# Altium footprint library lib_datalogger.PcbLib: 866 footprints (part 32 of 55)
Each footprint in its own frame and in the unit in brackets; x right, y up, seen from the top. Pads: shape width x height; smd on the part's side, far side on the other; paste and mask are expansions set on the pad; w line width, h text height; cw(c..) or ccw(c..) is an arc to the next point about the centre after c.
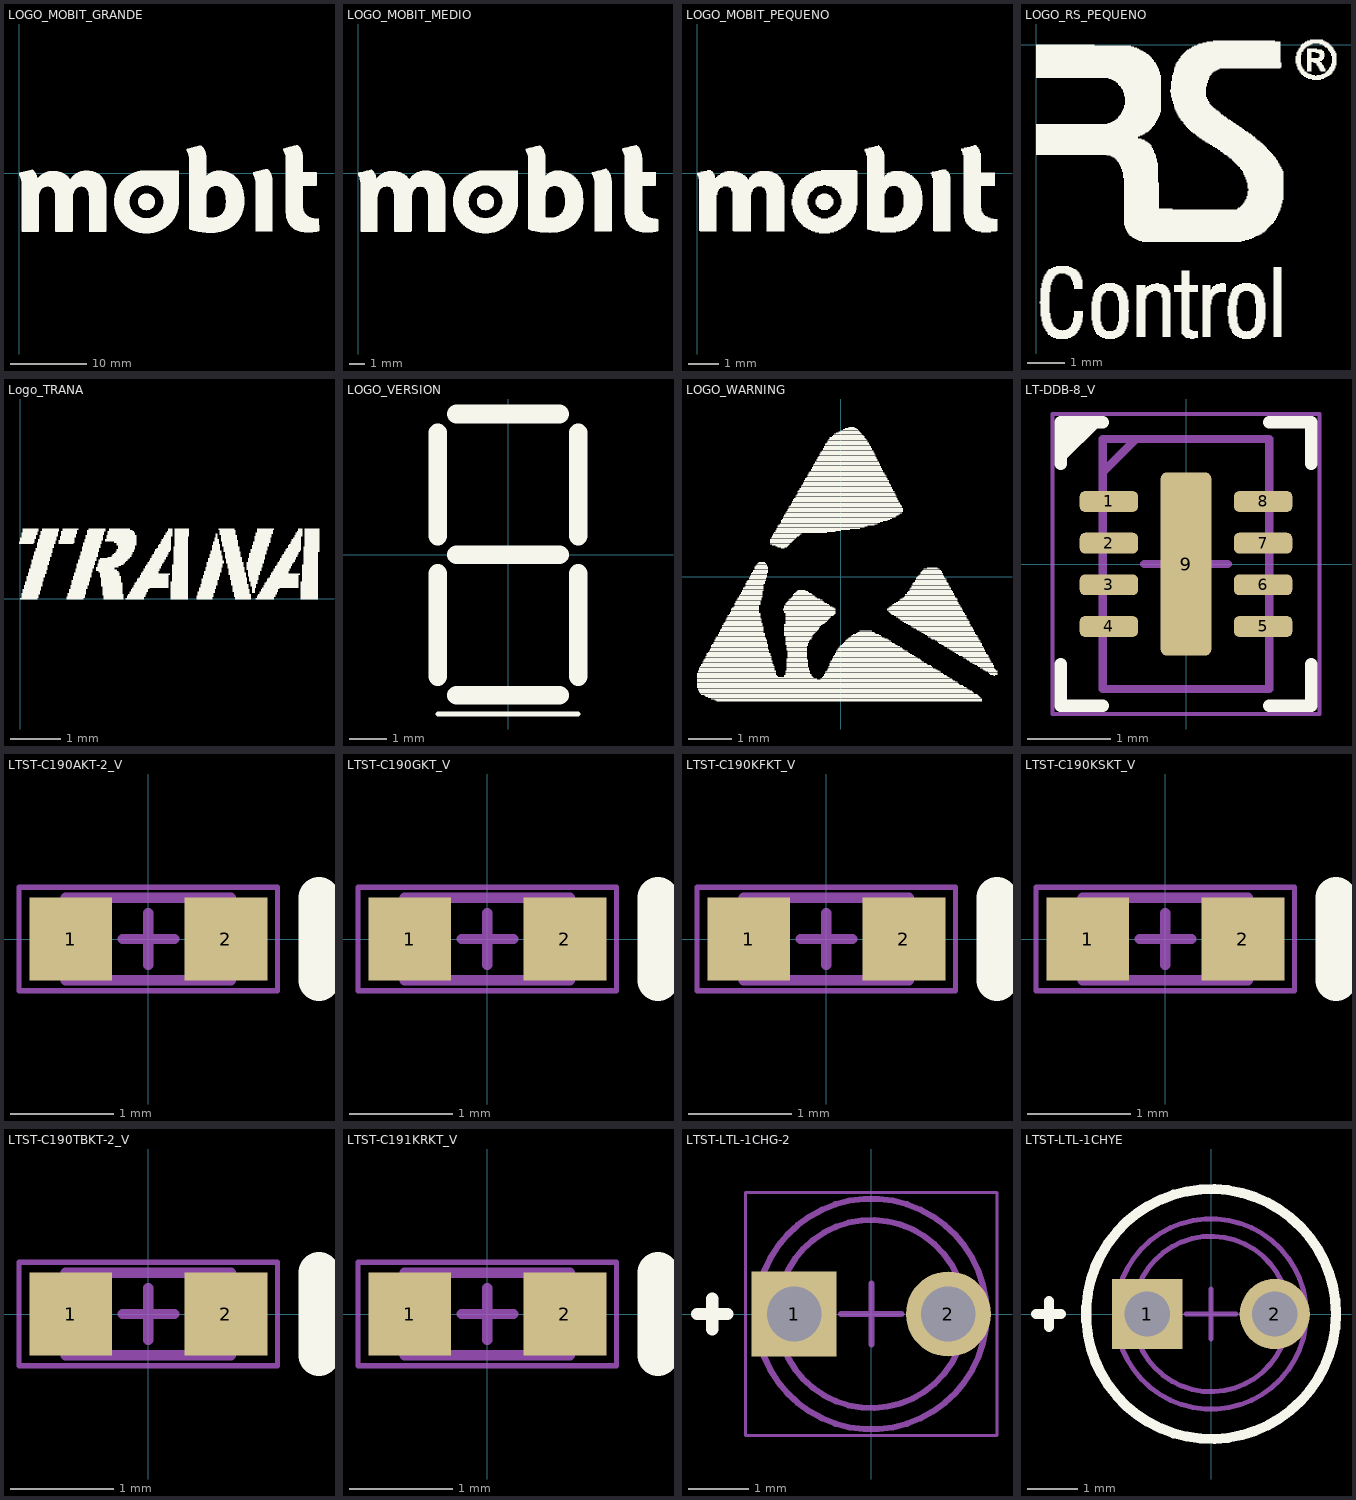
[diagram p31: the footprints below, top view; thin cyan lines are the x and y axes]

## LOGO_MOBIT_GRANDE [mm]
Top Overlay:
  drawing of 2847 lines, arcs and shapes, not listed

## LOGO_MOBIT_MEDIO [mm]
Top Overlay:
  drawing of 1430 lines, arcs and shapes, not listed

## LOGO_MOBIT_PEQUENO [mm]
Top Overlay:
  drawing of 712 lines, arcs and shapes, not listed

## LOGO_RS_PEQUENO [mm]
Top Overlay:
  drawing of 1124 lines, arcs and shapes, not listed

## Logo_TRANA [mm]
Top Overlay:
  drawing of 565 lines, arcs and shapes, not listed

## LOGO_VERSION [mm]
Top Overlay:
  lines w0.127: -1.905,-4.318 1.905,-4.318
  lines w0.508: -1.905,-3.302 -1.905,-0.508 ; -1.905,0.508 -1.905,3.302 ; -1.397,-3.81 1.397,-3.81 ; -1.397,0 1.397,0 ; -1.397,3.81 1.397,3.81 ; 1.905,-3.302 1.905,-0.508 ; 1.905,0.508 1.905,3.302

## LOGO_WARNING [mm] "WARNING SIGN"
Top Overlay:
  drawing of 457 lines, arcs and shapes, not listed

## LT-DDB-8_V [mm] "SON, 8-Leads, Body 3x2mm, Pitch 0.5mm, Thermal Pad 2.2x0.61mm"
height 0.8
pads (9):
  rrect50% 0.7x0.25 smd: 1(-0.925,0.75) 2(-0.925,0.25) 3(-0.925,-0.25) 4(-0.925,-0.75) 5(0.925,-0.75) 6(0.925,-0.25) 7(0.925,0.25) 8(0.925,0.75)
  rrect25% 0.61x2.2 smd: 9(0,0)
Top Overlay:
  region: -1.5,1.7 -1.5,1.3 -1.1,1.7
  lines w0.15: -1.5,-1.2 -1.5,-1.7 -1,-1.7 ; -1.5,1.2 -1.5,1.7 -1,1.7 ; -1.5,1.3 -1.1,1.7 ; 1,-1.7 1.5,-1.7 1.5,-1.2 ; 1,1.7 1.5,1.7 1.5,1.2
Mechanical 13:
  lines w0.1: -1,1.1 -0.6,1.5 ; -0.6,1.5 -0.6,1.5 ; -1,-1.5 -1,1.5 1,1.5 1,-1.5 -1,-1.5
Mechanical 15:
  lines w0.05: -1.6,-1.8 -1.6,1.8 1.6,1.8 1.6,-1.8 -1.6,-1.8
  lines w0.1: -0.5,0 0.5,0 ; 0,-0.5 0,0.5
Top Designator:
  text ".Designator" at -1.27,-0.127 h0.6
3D body "DFN-8_DDB.stp": height 0.8, standoff 0, extent -1.05,-1.55 1.05,1.55

## LTST-C190AKT-2_V [mm] "SMD, 2-Leads, Body 1.6x0.8mm"
height 0.8
pads (2):
  rect 0.8x0.8 smd: 1(-0.75,0) 2(0.75,0)
Top Overlay:
  lines w0.4: 1.65,-0.4 1.65,0.4
Mechanical 13:
  lines w0.1: -0.55,-0.4 -0.55,0.4 ; 0.55,-0.4 0.55,0.4 ; -0.8,-0.4 -0.8,0.4 0.8,0.4 0.8,-0.4 -0.8,-0.4
Mechanical 15:
  lines w0.05: -1.25,-0.5 1.25,-0.5 1.25,0.5 -1.25,0.5 -1.25,-0.5
  lines w0.1: -0.25,0 0.25,0 ; 0,-0.25 0,0.25
3D body: height 0.8, standoff 0.28, extent -0.55,-0.4 0.55,0.4
3D body: height 0.28, standoff 0, extent -0.8,-0.4 0.8,0.4

## LTST-C190GKT_V [mm] "SMD, 2-Leads, Body 1.6x0.8mm"
height 0.9
pads (2):
  rect 0.8x0.8 smd: 1(-0.75,0) 2(0.75,0)
Top Overlay:
  lines w0.4: 1.65,-0.4 1.65,0.4
Mechanical 13:
  lines w0.1: -0.55,-0.4 -0.55,0.4 ; 0.55,-0.4 0.55,0.4 ; -0.8,-0.4 0.8,-0.4 0.8,0.4 -0.8,0.4 -0.8,-0.4
Mechanical 15:
  lines w0.05: -1.25,-0.5 -1.25,0.5 1.25,0.5 1.25,-0.5 -1.25,-0.5
  lines w0.1: -0.25,0 0.25,0 ; 0,-0.25 0,0.25
3D body: height 0.38, standoff 0, extent -0.8,-0.4 0.8,0.4
3D body: height 0.9, standoff 0.38, extent -0.55,-0.4 0.55,0.4

## LTST-C190KFKT_V [mm] "SMD, 2-Leads, Body 1.6x0.8mm"
height 0.9
pads (2):
  rect 0.8x0.8 smd: 1(-0.75,0) 2(0.75,0)
Top Overlay:
  lines w0.4: 1.65,-0.4 1.65,0.4
Mechanical 13:
  lines w0.1: -0.55,-0.4 -0.55,0.4 ; 0.55,-0.4 0.55,0.4 ; -0.8,-0.4 -0.8,0.4 0.8,0.4 0.8,-0.4 -0.8,-0.4
Mechanical 15:
  lines w0.05: -1.25,-0.5 1.25,-0.5 1.25,0.5 -1.25,0.5 -1.25,-0.5
  lines w0.1: -0.25,0 0.25,0 ; 0,-0.25 0,0.25
3D body: height 0.9, standoff 0.28, extent -0.55,-0.4 0.55,0.4
3D body: height 0.28, standoff 0, extent -0.8,-0.4 0.8,0.4

## LTST-C190KSKT_V [mm] "SMD, 2-Leads, Body 1.6x0.8mm"
height 0.9
pads (2):
  rect 0.8x0.8 smd: 1(-0.75,0) 2(0.75,0)
Top Overlay:
  lines w0.4: 1.65,-0.4 1.65,0.4
Mechanical 13:
  lines w0.1: -0.55,-0.4 -0.55,0.4 ; 0.55,-0.4 0.55,0.4 ; -0.8,-0.4 -0.8,0.4 0.8,0.4 0.8,-0.4 -0.8,-0.4
Mechanical 15:
  lines w0.05: -1.25,-0.5 1.25,-0.5 1.25,0.5 -1.25,0.5 -1.25,-0.5
  lines w0.1: -0.25,0 0.25,0 ; 0,-0.25 0,0.25
3D body: height 0.9, standoff 0.28, extent -0.55,-0.4 0.55,0.4
3D body: height 0.28, standoff 0, extent -0.8,-0.4 0.8,0.4

## LTST-C190TBKT-2_V [mm] "SMD, 2-Leads, Body 1.6x0.8mm"
height 0.9
pads (2):
  rect 0.8x0.8 smd: 1(-0.75,0) 2(0.75,0)
Top Overlay:
  lines w0.4: 1.65,-0.4 1.65,0.4
Mechanical 13:
  lines w0.1: -0.8,-0.4 -0.8,0.4 0.8,0.4 0.8,-0.4 -0.8,-0.4
Mechanical 15:
  lines w0.05: -1.25,-0.5 1.25,-0.5 1.25,0.5 -1.25,0.5 -1.25,-0.5
  lines w0.1: -0.25,0 0.25,0 ; 0,-0.25 0,0.25
3D body: height 0.8, standoff 0.28, extent -0.55,-0.4 0.55,0.4
3D body: height 0.28, standoff 0, extent -0.8,-0.4 0.8,0.4

## LTST-C191KRKT_V [mm] "SMD, 2-Leads, Body 1.6x0.8mm"
height 0.9
pads (2):
  rect 0.8x0.8 smd: 1(-0.75,0) 2(0.75,0)
Top Overlay:
  lines w0.4: 1.65,-0.4 1.65,0.4
Mechanical 13:
  lines w0.1: -0.55,-0.4 -0.55,0.4 ; 0.55,-0.4 0.55,0.4 ; -0.8,-0.4 -0.8,0.4 0.8,0.4 0.8,-0.4 -0.8,-0.4
Mechanical 15:
  lines w0.05: -1.25,-0.5 1.25,-0.5 1.25,0.5 -1.25,0.5 -1.25,-0.5
  lines w0.1: -0.25,0 0.25,0 ; 0,-0.25 0,0.25
3D body: height 0.9, standoff 0.38, extent -0.55,-0.4 0.55,0.4
3D body: height 0.38, standoff 0, extent -0.8,-0.4 0.8,0.4

## LTST-LTL-1CHG-2 [mm] "TH, 2-Leads, Dia 3.8mm"
height 6.5
pads (2):
  rect 1.4x1.4 hole 0.9: 1(-1.27,0)
  round 1.4 hole 0.9: 2(1.27,0)
Top Overlay:
  lines w0.2: -2.87,0 -2.37,0 ; -2.62,-0.25 -2.62,0.25
Mechanical 13:
  circle w0.1: c0,0 r1.55
  circle w0.1: c0,0 r1.9
Mechanical 15:
  lines w0.05: -2.07,-1.999 2.07,-1.999 2.07,1.999 -2.07,1.999 -2.07,-1.999
  lines w0.1: -0.5,0 0.5,0 ; 0,-0.5 0,0.5
3D body: height 1, standoff -24, extent -1.495,-0.2 -1.045,0.2
3D body: height 1, standoff -23, extent 1.045,-0.2 1.495,0.2
3D body: height 6.5, standoff 3.4, extent -1.538,-1.547 1.55,1.547
3D body: height 4.95, standoff 1, extent -1.549,-1.549 1.55,1.55
3D body: height 1.7, standoff 1, extent -1.899,-1.899 1.9,1.9

## LTST-LTL-1CHYE [mm] "THD, 2-Leads, Dia 3.8mm, Pitch 2.54mm"
height 6.5
pads (2):
  rect 1.4x1.4 hole 0.9: 1(-1.27,0)
  round 1.4 hole 0.9: 2(1.27,0)
Top Overlay:
  circle w0.2: c0,0 r2.491
  lines w0.2: -3.489,0 -2.991,0 ; -3.23,-0.254 -3.23,0.254
Mechanical 13:
  circle w0.1: c0,0 r1.55
  circle w0.1: c0,0 r1.9
Mechanical 15:
  lines w0.1: -0.5,0 0.5,0 ; 0,-0.5 0,0.5
3D body: height 2.2, standoff 0, extent -1.9,-1.899 1.9,1.9
3D body: height 4.95, standoff 2.2, extent -1.55,-1.55 1.55,1.55
3D body: height 6.5, standoff 3.4, extent -1.548,-1.549 1.55,1.55
3D body: height 0, standoff -25, extent -1.47,-0.225 -1.07,0.225
3D body: height 0, standoff -24, extent 1.07,-0.225 1.47,0.225